# Altium schematic symbol library FPGA_Xilinx_Virtex7.SchLib: 34 symbols (part 31 of 34) (continued)
## XC7VX980T-FFG1930 (continued)
part M pins: AC1 MGTHTXN3_116 (io), AC2 MGTHTXP3_116 (io), AC5 MGTHRXN3_116 (io), AC6 MGTHRXP3_116 (io), AD7 MGTREFCLK0N_116 (io), AD8 MGTREFCLK0P_116 (io), AE1 MGTHTXN2_116 (io), AE2 MGTHTXP2_116 (io), AE5 MGTHRXN2_116 (io), AE6 MGTHRXP2_116 (io), AF3 MGTHTXN1_116 (io), AF4 MGTHTXP1_116 (io), AF7 MGTREFCLK1N_116 (io), AF8 MGTREFCLK1P_116 (io), AG1 MGTHTXN0_116 (io), AG2 MGTHTXP0_116 (io), AG5 MGTHRXN0_116 (io), AG6 MGTHRXP0_116 (io), AH3 MGTHRXN1_116 (io), AH4 MGTHRXP1_116 (io), AJ1 MGTHTXN3_115 (io), AJ2 MGTHTXP3_115 (io), AJ5 MGTHRXN3_115 (io), AJ6 MGTHRXP3_115 (io), AK3 MGTHTXN2_115 (io), AK4 MGTHTXP2_115 (io), AL1 MGTHTXN1_115 (io), AL2 MGTHTXP1_115 (io), AL5 MGTHRXN1_115 (io), AL6 MGTHRXP1_115 (io), AM3 MGTHRXN2_115 (io), AM4 MGTHRXP2_115 (io), AM7 MGTREFCLK0N_115 (io), AM8 MGTREFCLK0P_115 (io), AN1 MGTHTXN0_115 (io), AN2 MGTHTXP0_115 (io), AN5 MGTHRXN0_115 (io), AN6 MGTHRXP0_115 (io), AP7 MGTREFCLK1N_115 (io), AP8 MGTREFCLK1P_115 (io)
part N pins: AA1 MGTHTXN1_117 (io), AA2 MGTHTXP1_117 (io), AA5 MGTHRXN1_117 (io), AA6 MGTHRXP1_117 (io), AB3 MGTHTXN0_117 (io), AB4 MGTHTXP0_117 (io), AB7 MGTREFCLK1N_117 (io), AB8 MGTREFCLK1P_117 (io), AD3 MGTHRXN0_117 (io), AD4 MGTHRXP0_117 (io), N1 MGTHTXN3_118 (io), N2 MGTHTXP3_118 (io), N5 MGTHRXN3_118 (io), N6 MGTHRXP3_118 (io), P3 MGTHTXN2_118 (io), P4 MGTHTXP2_118 (io), R1 MGTHTXN1_118 (io), R2 MGTHTXP1_118 (io), R5 MGTHRXN2_118 (io), R6 MGTHRXP2_118 (io), T3 MGTHRXN1_118 (io), T4 MGTHRXP1_118 (io), T7 MGTREFCLK0N_118 (io), T8 MGTREFCLK0P_118 (io), U1 MGTHTXN0_118 (io), U2 MGTHTXP0_118 (io), U5 MGTHRXN0_118 (io), U6 MGTHRXP0_118 (io), V3 MGTHTXN3_117 (io), V4 MGTHTXP3_117 (io), V7 MGTREFCLK1N_118 (io), V8 MGTREFCLK1P_118 (io), W1 MGTHTXN2_117 (io), W2 MGTHTXP2_117 (io), W5 MGTHRXN3_117 (io), W6 MGTHRXP3_117 (io), Y3 MGTHRXN2_117 (io), Y4 MGTHRXP2_117 (io), Y7 MGTREFCLK0N_117 (io), Y8 MGTREFCLK0P_117 (io)
part O pins: AB2 MGTAVTT_G11 (power), AB6 MGTAVCC_G11 (power), AC4 MGTAVTT_G11 (power), AC8 MGTAVCC_G11 (power), AF2 MGTAVTT_G11 (power), AF6 MGTAVCC_G11 (power), AG4 MGTAVTT_G11 (power), AG8 MGTVCCAUX_G11 (power), AH6 MGTAVCC_G11 (power), AJ8 MGTVCCAUX_G10 (power), AK2 MGTAVTT_G10 (power), AK6 MGTAVCC_G10 (power), AK7 MGTAVTTRCAL_115 (power), AK8 MGTRREF_115 (power), AL4 MGTAVTT_G10 (power), AL8 MGTAVCC_G10 (power), AP2 MGTAVTT_G10 (power), AP6 MGTAVCC_G10 (power), AR4 MGTAVTT_G10 (power), AR8 MGTAVCC_G10 (power), AV2 MGTAVTT_G10 (power), AV6 MGTAVCC_G10 (power), AW4 MGTAVTT_G10 (power), AW8 MGTAVCC_G10 (power), BB2 MGTAVTT_G10 (power), BB6 MGTAVCC_G10 (power), BC4 MGTAVTT_G10 (power), BC8 MGTAVCC_G10 (power), P2 MGTAVTT_G11 (power), P6 MGTAVCC_G11 (power), R4 MGTAVTT_G11 (power), R8 MGTAVCC_G11 (power), V2 MGTAVTT_G11 (power), V6 MGTAVCC_G11 (power), W4 MGTAVTT_G11 (power), W8 MGTAVCC_G11 (power)
part P pins: AA10 TDI_0 (io), AB11 TDO_0 (io), AB22 VREFN_0 (io), AB23 VP_0 (io), AC10 INIT_B_0 (io), AC22 VN_0 (io), AC23 VREFP_0 (io), AD11 DONE_0 (io), AD22 DXN_0 (io), AD23 DXP_0 (io), AE10 PROGRAM_B_0 (io), AF11 CFGBVS_0 (io), AG10 M2_0 (io), AH11 M0_0 (io), AJ10 M1_0 (io), AJ11 VCCO_0 (power), AK10 VCCO_0 (power), V11 CCLK_0 (io), W10 TCK_0 (io), Y11 TMS_0 (io)
part Q pins: A12 GND (power), A22 GND (power), A32 GND (power), A42 GND (power), AA11 VCCINT (power), AA13 VCCINT (power), AA15 VCCINT (power), AA17 VCCAUX (power), AA19 VCCAUX_IO_G6 (power), AA21 VCCINT (power), AA22 GNDADC_0 (power), AA23 VCCADC_0 (power), AA25 VCCAUX_IO_G2 (power), AA27 VCCAUX_IO_G1 (power), AA29 VCCINT (power), AA31 VCCINT (power), AA33 VCCINT (power), AB10 VCCINT (power), AB12 VCCINT (power), AB14 VCCINT (power), AB16 VCCINT (power), AB18 VCCAUX_IO_G6 (power), AB20 VCCINT (power), AB24 VCCBRAM (power), AB26 VCCAUX_IO_G1 (power), AB28 VCCAUX (power), AB30 VCCINT (power), AB32 VCCINT (power), AC11 VCCINT (power), AC13 VCCINT (power), AC15 VCCINT (power), AC17 VCCAUX (power), AC19 VCCAUX_IO_G5 (power), AC21 VCCINT (power), AC25 VCCBRAM (power), AC27 VCCAUX_IO_G1 (power), AC29 VCCINT (power), AC31 VCCINT (power), AC33 VCCINT (power), AD10 VCCINT (power), AD12 VCCINT (power), AD14 VCCINT (power), AD16 VCCINT (power), AD18 VCCAUX_IO_G5 (power), AD20 VCCINT (power), AD24 VCCBRAM (power), AD26 VCCAUX_IO_G0 (power), AD28 VCCAUX (power), AD30 VCCINT (power), AD32 VCCINT (power), AE11 VCCINT (power), AE13 VCCINT (power), AE15 VCCINT (power), AE17 VCCAUX (power), AE19 VCCAUX_IO_G5 (power), AE21 VCCINT (power), AE23 VCCBRAM (power), AE25 VCCBRAM (power), AE27 VCCAUX_IO_G0 (power), AE29 VCCINT (power), AE31 VCCINT (power), AE33 VCCINT (power), AF10 VCCINT (power), AF12 VCCINT (power), AF14 VCCINT (power), AF16 VCCINT (power), AF18 VCCAUX_IO_G4 (power), AF20 VCCAUX_IO_G4 (power), AF22 VCCINT (power), AF24 VCCBRAM (power), AF26 VCCAUX_IO_G0 (power), AF28 VCCAUX (power), AF30 VCCINT (power), AF32 VCCINT (power), AG11 VCCINT (power), AG13 VCCINT (power), AG15 VCCINT (power), AG17 VCCAUX (power), AG19 VCCAUX_IO_G4 (power), AG21 VCCINT (power), AG23 VCCINT (power), AG25 VCCBRAM (power), AG27 VCCAUX (power), AG29 VCCINT (power), AG31 VCCINT (power), AG33 VCCINT (power), AH10 VCCINT (power), AH12 VCCINT (power), B9 GND (power), B19 GND (power), B29 GND (power), B39 GND (power), C6 GND (power), C16 GND (power), C26 GND (power), C36 GND (power), D3 GND (power), D13 GND (power), D23 GND (power), D33 GND (power), D43 GND (power), E10 GND (power), E20 GND (power), E30 GND (power), E40 GND (power), F7 GND (power), F17 GND (power), F27 GND (power), F37 GND (power), G4 GND (power), G14 GND (power), G24 GND (power), G34 GND (power), G44 GND (power), H1 GND (power), H11 GND (power), H21 GND (power), H31 GND (power), H41 GND (power), J8 GND (power), J18 GND (power), J28 GND (power), J38 GND (power), K5 GND (power), K15 GND (power), K25 GND (power), K35 GND (power), L2 GND (power), L12 GND (power), L22 GND (power), L32 GND (power), L42 GND (power), M1 GND (power), M2 GND (power), M3 GND (power), M4 GND (power), M5 GND (power), M6 GND (power), M7 GND (power), M9 GND (power), M19 GND (power), M29 GND (power), M39 GND (power), N3 GND (power), N4 GND (power), N7 GND (power), N8 GND (power), N9 GND (power), N16 GND (power), N26 GND (power), N36 GND (power), P1 GND (power), P5 GND (power), P9 GND (power), P13 GND (power), P23 GND (power), P33 GND (power), P43 GND (power), R3 GND (power), R7 GND (power), R9 GND (power), R10 GND (power), R20 GND (power), R30 GND (power), R40 GND (power), T1 GND (power), T2 GND (power), T5 GND (power), T6 GND (power), T9 GND (power), T10 VCCINT (power), T11 GND (power), T17 GND (power), T27 GND (power), T37 GND (power), U3 GND (power), U4 GND (power), U7 GND (power), U8 GND (power), U9 GND (power), U10 VCCBATT_0 (power), U11 VCCINT (power), U12 GND (power), U13 VCCINT (power), U14 GND (power), U24 GND (power), U27 VCCAUX_IO_G3 (power), U28 GND (power), U34 GND (power), V10 VCCINT (power), V12 VCCINT (power), V14 VCCINT (power), V16 VCCINT (power), V18 VCCAUX (power), V20 VCCINT (power), V22 VCCINT (power), V24 VCCBRAM (power), V26 VCCAUX_IO_G3 (power), V28 VCCAUX (power), V30 VCCINT (power), V32 VCCINT (power), W11 VCCINT (power), W13 VCCINT (power), W15 VCCINT (power), W17 VCCAUX (power), W19 VCCAUX_IO_G7 (power), W21 VCCINT (power), W23 VCCBRAM (power), W25 VCCAUX_IO_G2 (power), W27 VCCAUX_IO_G3 (power), W29 VCCINT (power), W31 VCCINT (power), W33 VCCINT (power), Y10 VCCINT (power), Y12 VCCINT (power), Y14 VCCINT (power), Y16 VCCINT (power), Y18 VCCAUX_IO_G6 (power), Y20 VCCINT (power), Y22 VCCINT (power), Y24 VCCBRAM (power), Y26 VCCAUX_IO_G2 (power), Y28 VCCAUX (power), Y30 VCCINT (power), Y32 VCCINT (power)
part R pins: AA3 GND (power), AA4 GND (power), AA7 GND (power), AA8 GND (power), AA9 GND (power), AA12 GND (power), AA14 GND (power), AA16 GND (power), AA18 GND (power), AA20 GND (power), AA24 GND (power), AA26 GND (power), AA28 GND (power), AA30 GND (power), AA32 GND (power), AA42 GND (power), AB1 GND (power), AB5 GND (power), AB9 GND (power), AB13 GND (power), AB15 GND (power), AB17 GND (power), AB19 GND (power), AB21 GND (power), AB25 GND (power), AB27 GND (power), AB29 GND (power), AB31 GND (power), AB33 GND (power), AB39 GND (power), AC3 GND (power), AC7 GND (power), AC9 GND (power), AC12 GND (power), AC14 GND (power), AC16 GND (power), AC18 GND (power), AC20 GND (power), AC24 GND (power), AC26 GND (power), AC28 GND (power), AC30 GND (power), AC32 GND (power), AC36 GND (power), AD1 GND (power), AD2 GND (power), AD5 GND (power), AD6 GND (power), AD9 GND (power), AD13 GND (power), AD15 GND (power), AD17 GND (power), AD19 GND (power), AD21 GND (power), AD25 GND (power), AD27 GND (power), AD29 GND (power), AD31 GND (power), AD33 GND (power), AD43 GND (power), AE3 GND (power), AE4 GND (power), AE7 GND (power), AE8 GND (power), AE9 GND (power), AE12 GND (power), AE14 GND (power), AE16 GND (power), AE18 GND (power), AE20 GND (power), AE22 GND (power), AE24 GND (power), AE26 GND (power), AE28 GND (power), AE30 GND (power), AE32 GND (power), AE40 GND (power), AF1 GND (power), AF5 GND (power), AF9 GND (power), AF13 GND (power), AF15 GND (power), AF17 GND (power), AF19 GND (power), AF21 GND (power), AF23 GND (power), AF25 GND (power), AF27 GND (power), AF29 GND (power), AF31 GND (power), AF33 GND (power), AF37 GND (power), AG3 GND (power), AG7 GND (power), AG9 GND (power), AG12 GND (power), AG14 GND (power), AG16 GND (power), AG18 GND (power), AG20 GND (power), AG22 GND (power), AG24 GND (power), AG26 GND (power), AG28 GND (power), AG30 GND (power), AG32 GND (power), AG34 GND (power), AG44 GND (power), AH1 GND (power), AH2 GND (power), AH5 GND (power), AH7 GND (power), AH8 GND (power), AH9 GND (power), AH13 GND (power), AH21 GND (power), AH31 GND (power), AH33 GND (power), AH41 GND (power), AJ3 GND (power), AJ4 GND (power), AJ7 GND (power), AJ9 GND (power), AJ18 GND (power), AJ28 GND (power), AJ38 GND (power), AK1 GND (power), AK5 GND (power), AK9 GND (power), AK15 GND (power), AK25 GND (power), AK35 GND (power), AL3 GND (power), AL7 GND (power), AL9 GND (power), AL12 GND (power), AL22 GND (power), AL32 GND (power), AL42 GND (power), AM1 GND (power), AM2 GND (power), AM5 GND (power), AM6 GND (power), AM9 GND (power), AM19 GND (power), AM29 GND (power), AM39 GND (power), AN3 GND (power), AN4 GND (power), AN7 GND (power), AN8 GND (power), AN9 GND (power), AN16 GND (power), AN26 GND (power), AN36 GND (power), AP1 GND (power), AP5 GND (power), AP9 GND (power), AP13 GND (power), AP23 GND (power), AP33 GND (power), AP43 GND (power), AR3 GND (power), AR7 GND (power), AR9 GND (power), AR10 GND (power), AR20 GND (power), AR30 GND (power), AR40 GND (power), AT1 GND (power), AT2 GND (power), AT5 GND (power), AT6 GND (power), AT9 GND (power), AT17 GND (power), AT27 GND (power), AT37 GND (power), AU3 GND (power), AU4 GND (power), AU7 GND (power), AU8 GND (power), AU9 GND (power), AU14 GND (power), AU24 GND (power), AU34 GND (power), AU44 GND (power), AV1 GND (power), AV5 GND (power), AV9 GND (power), AV11 GND (power), AV21 GND (power), AV31 GND (power), AV41 GND (power), AW3 GND (power), AW7 GND (power), AW9 GND (power), AW18 GND (power), AW28 GND (power), AW38 GND (power), AY1 GND (power), AY2 GND (power), AY5 GND (power), AY6 GND (power), AY9 GND (power), AY15 GND (power), AY25 GND (power), AY35 GND (power), BA3 GND (power), BA4 GND (power), BA7 GND (power), BA8 GND (power), BA9 GND (power), BA12 GND (power), BA22 GND (power), BA32 GND (power), BA42 GND (power), BB1 GND (power), BB5 GND (power), BB9 GND (power), BB19 GND (power), BB29 GND (power), BB39 GND (power), BC2 GND (power), BC3 GND (power), BC7 GND (power), BC9 GND (power), BC16 GND (power), BC26 GND (power), BC36 GND (power), BD5 GND (power), BD6 GND (power), BD9 GND (power), BD13 GND (power), BD23 GND (power), BD33 GND (power), U44 GND (power), V1 GND (power), V5 GND (power), V9 GND (power), V13 GND (power), V15 GND (power), V17 GND (power), V19 GND (power), V21 GND (power), V23 GND (power), V25 GND (power), V27 GND (power), V29 GND (power), V31 GND (power), V33 GND (power), V41 GND (power), W3 GND (power), W7 GND (power), W9 GND (power), W12 GND (power), W14 GND (power), W16 GND (power), W18 GND (power), W20 GND (power), W22 GND (power), W24 GND (power), W26 GND (power), W28 GND (power), W30 GND (power), W32 GND (power), W38 GND (power), Y1 GND (power), Y2 GND (power), Y5 GND (power), Y6 GND (power), Y9 GND (power), Y13 GND (power), Y15 GND (power), Y17 GND (power), Y19 GND (power), Y21 GND (power), Y23 GND (power), Y25 GND (power), Y27 GND (power), Y29 GND (power), Y31 GND (power), Y33 GND (power), Y35 GND (power)

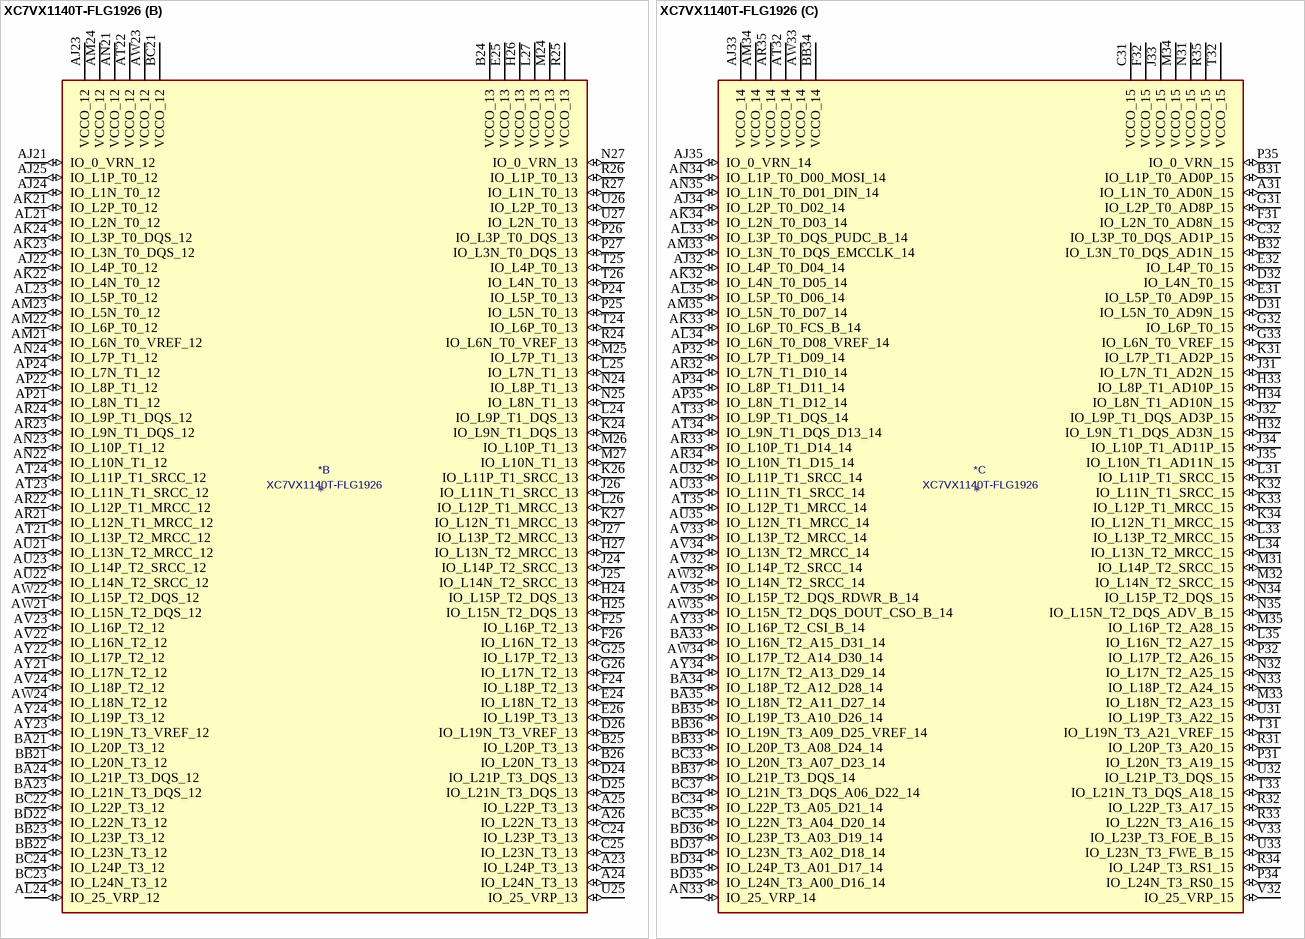
[diagram p156: symbol XC7VX1140T-FLG1926]

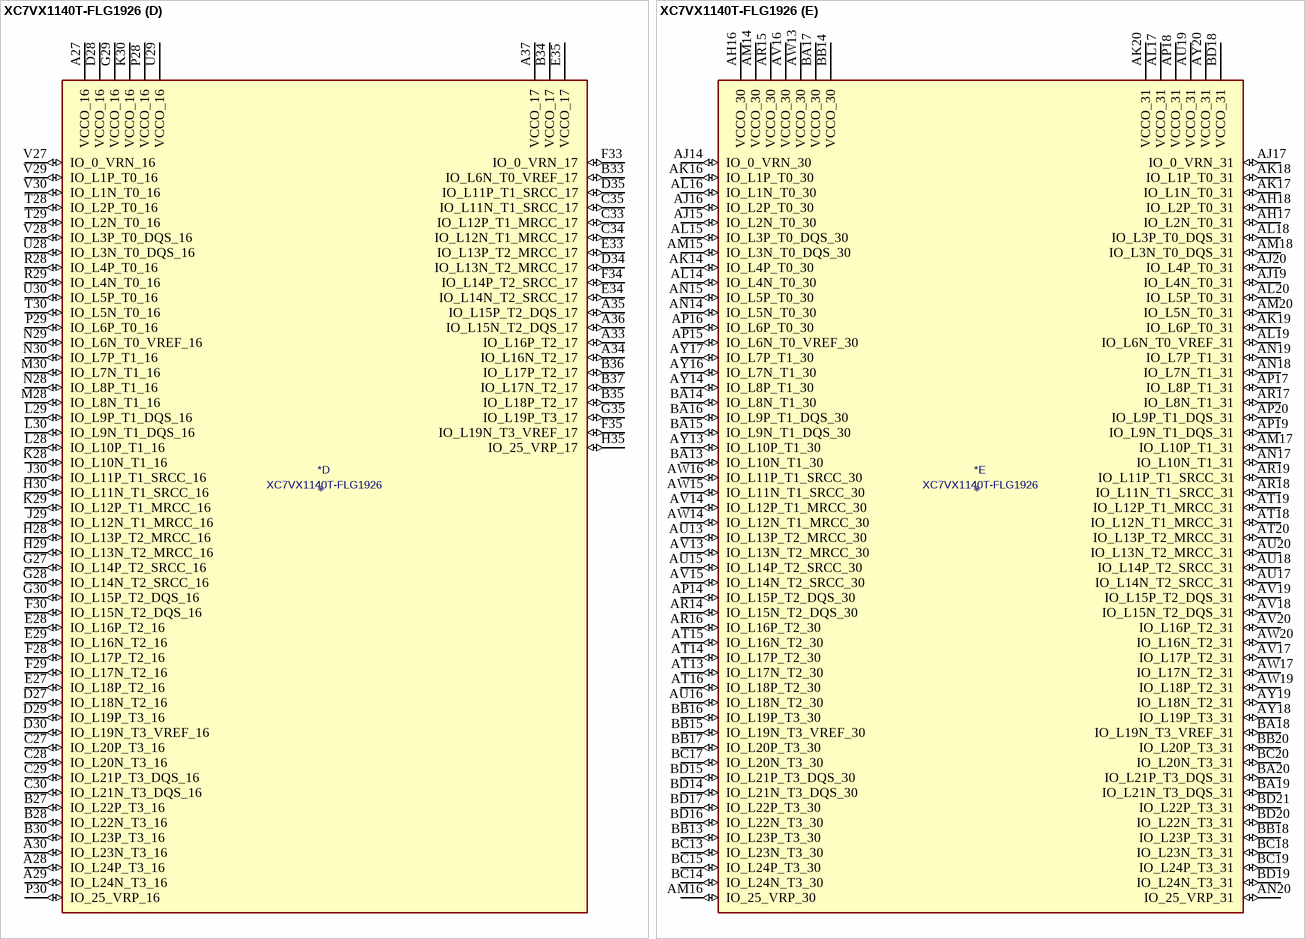
[diagram p157: symbol XC7VX1140T-FLG1926]

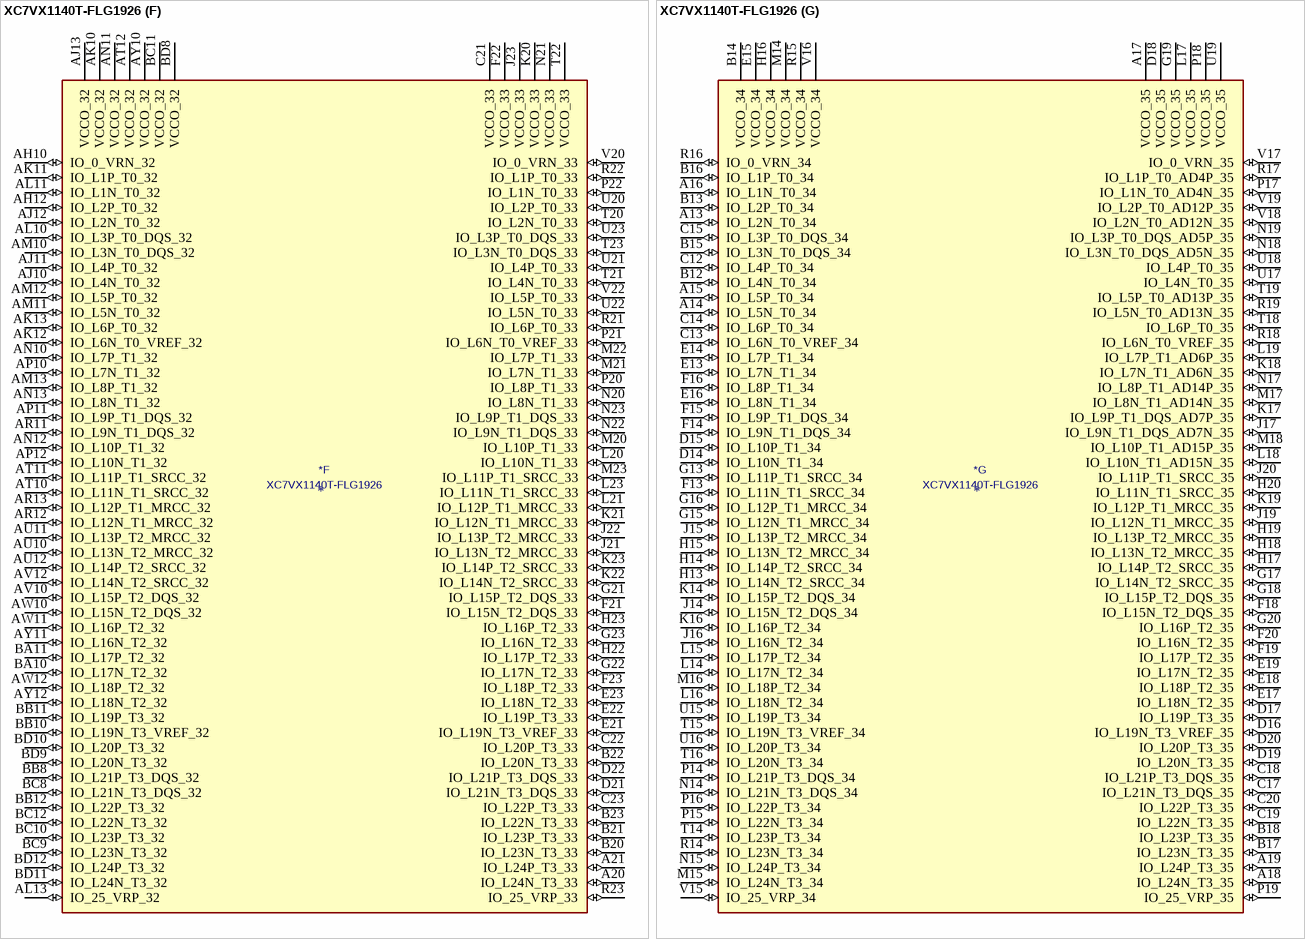
[diagram p158: symbol XC7VX1140T-FLG1926]

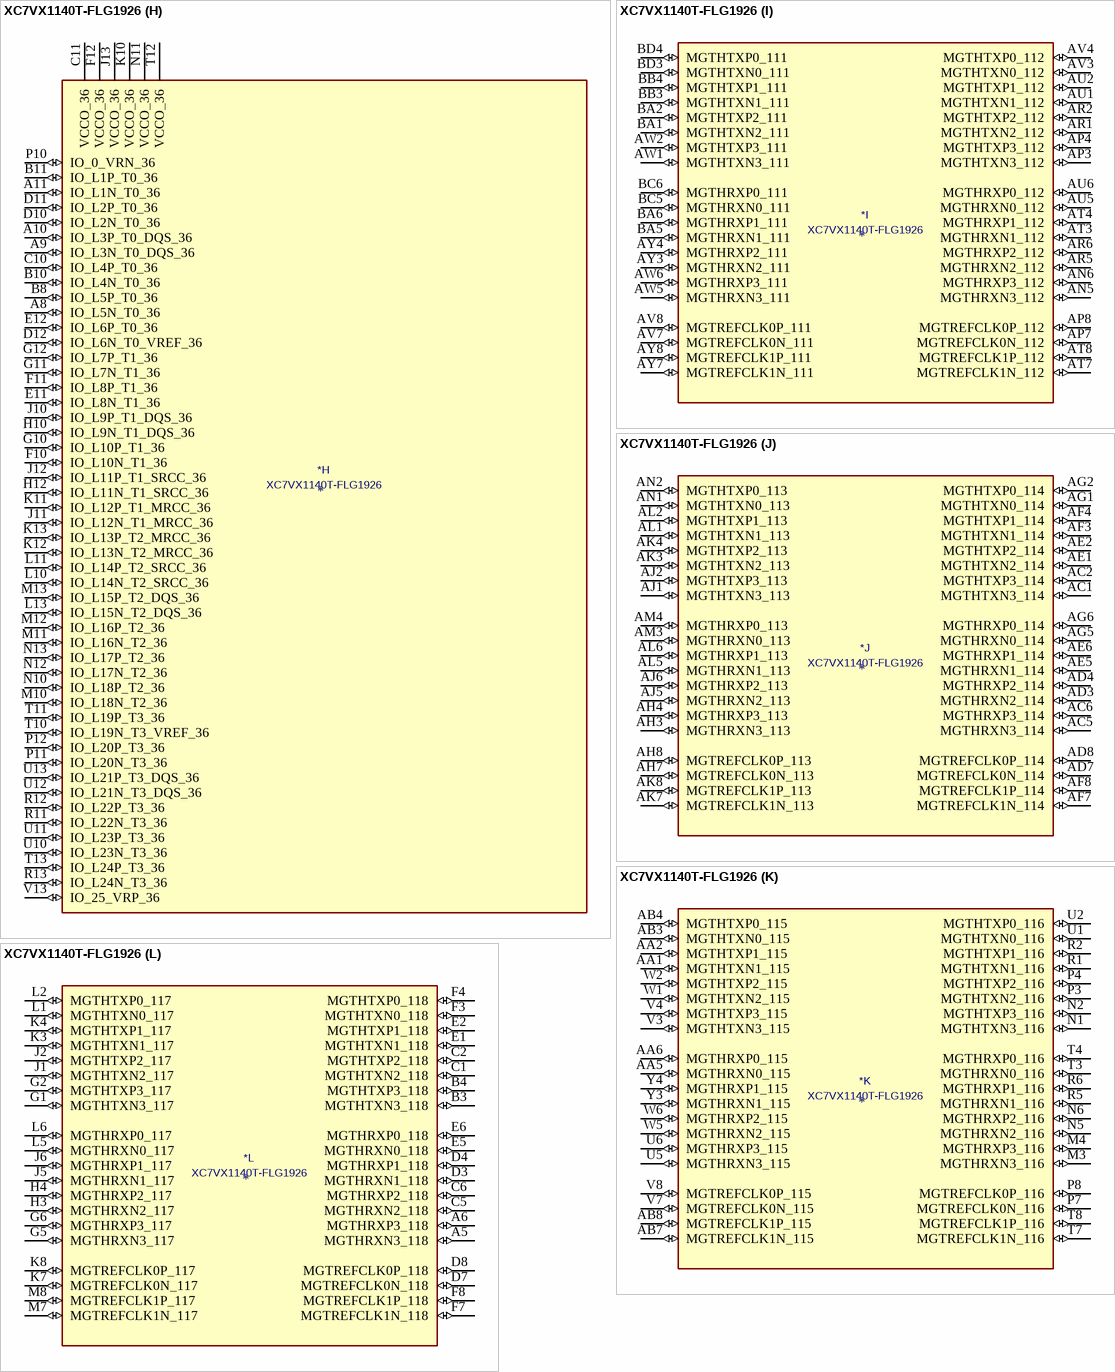
[diagram p159: symbol XC7VX1140T-FLG1926]

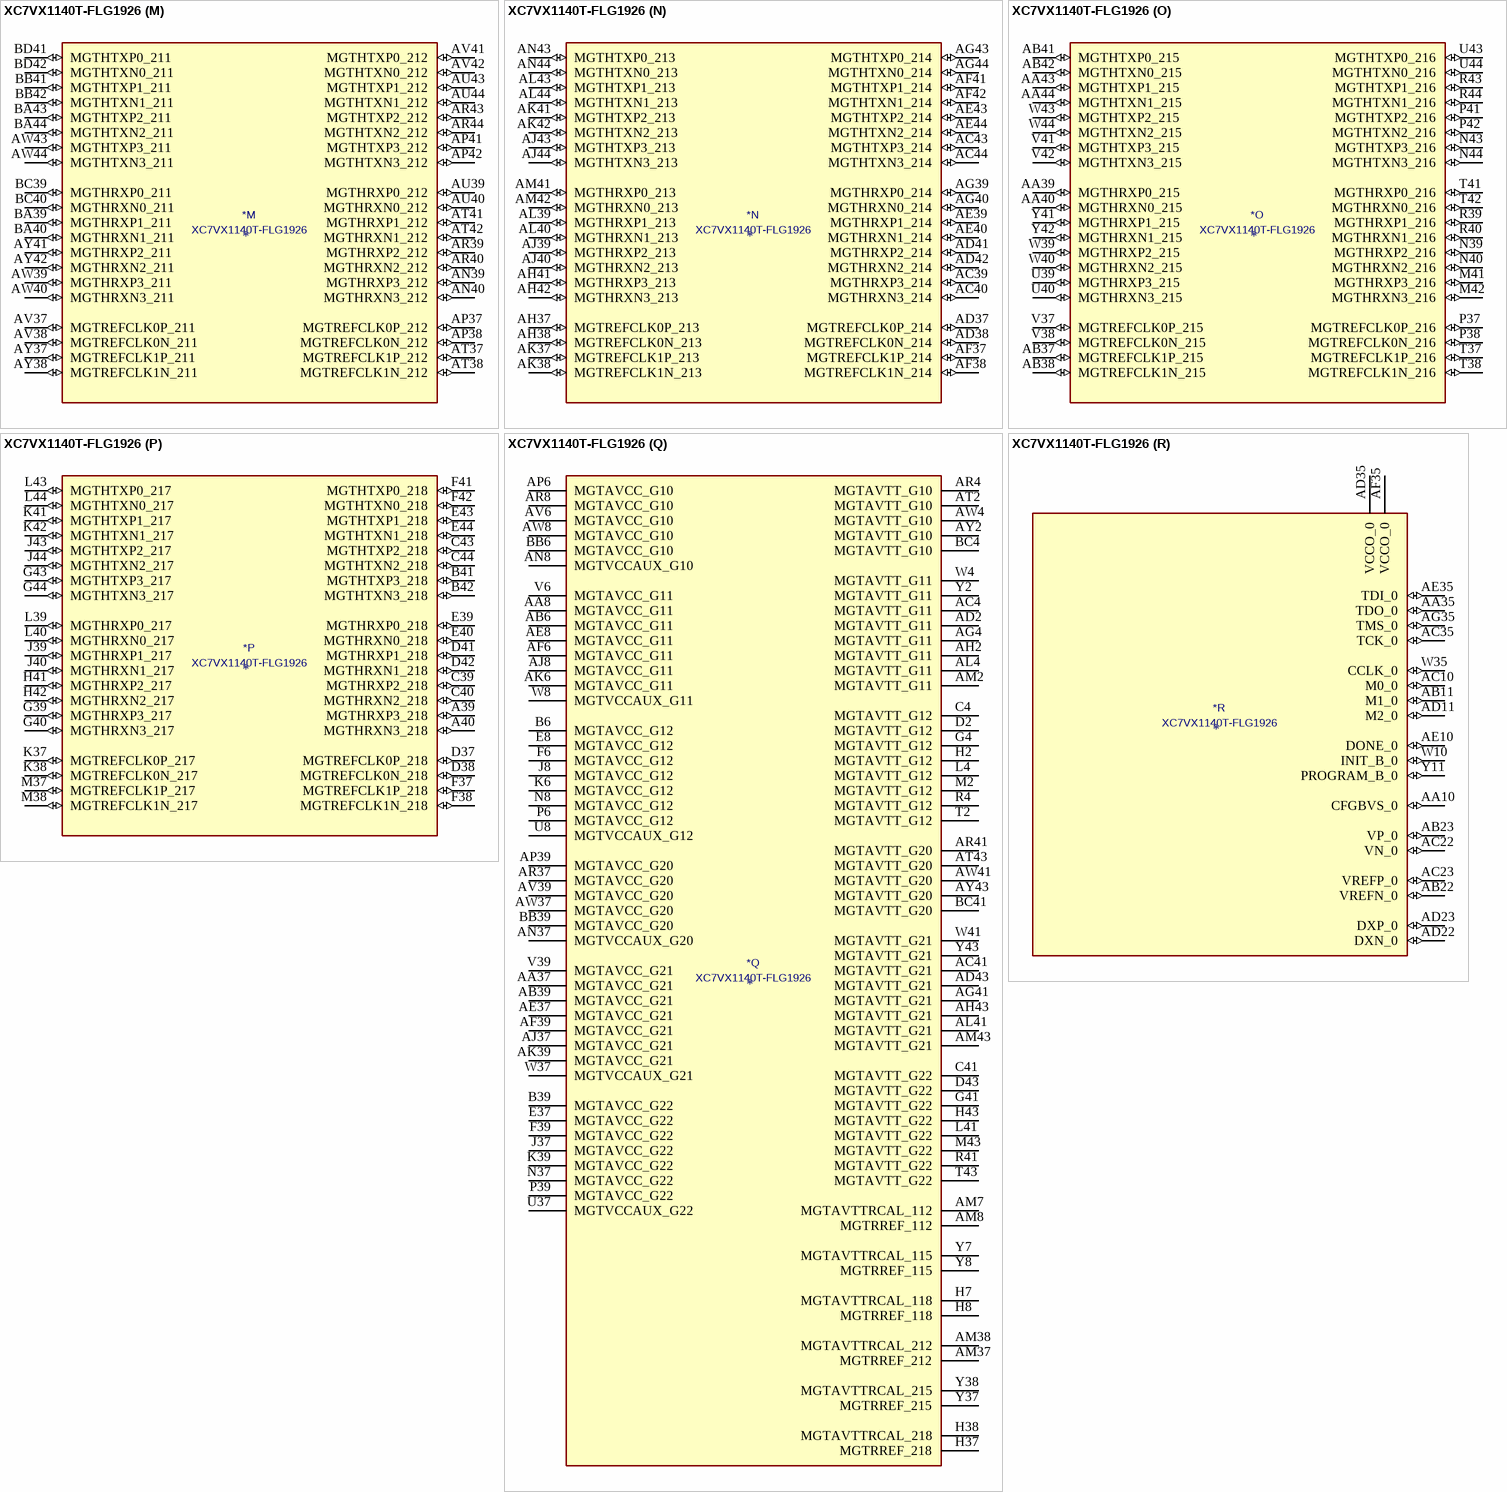
[diagram p160: symbol XC7VX1140T-FLG1926]

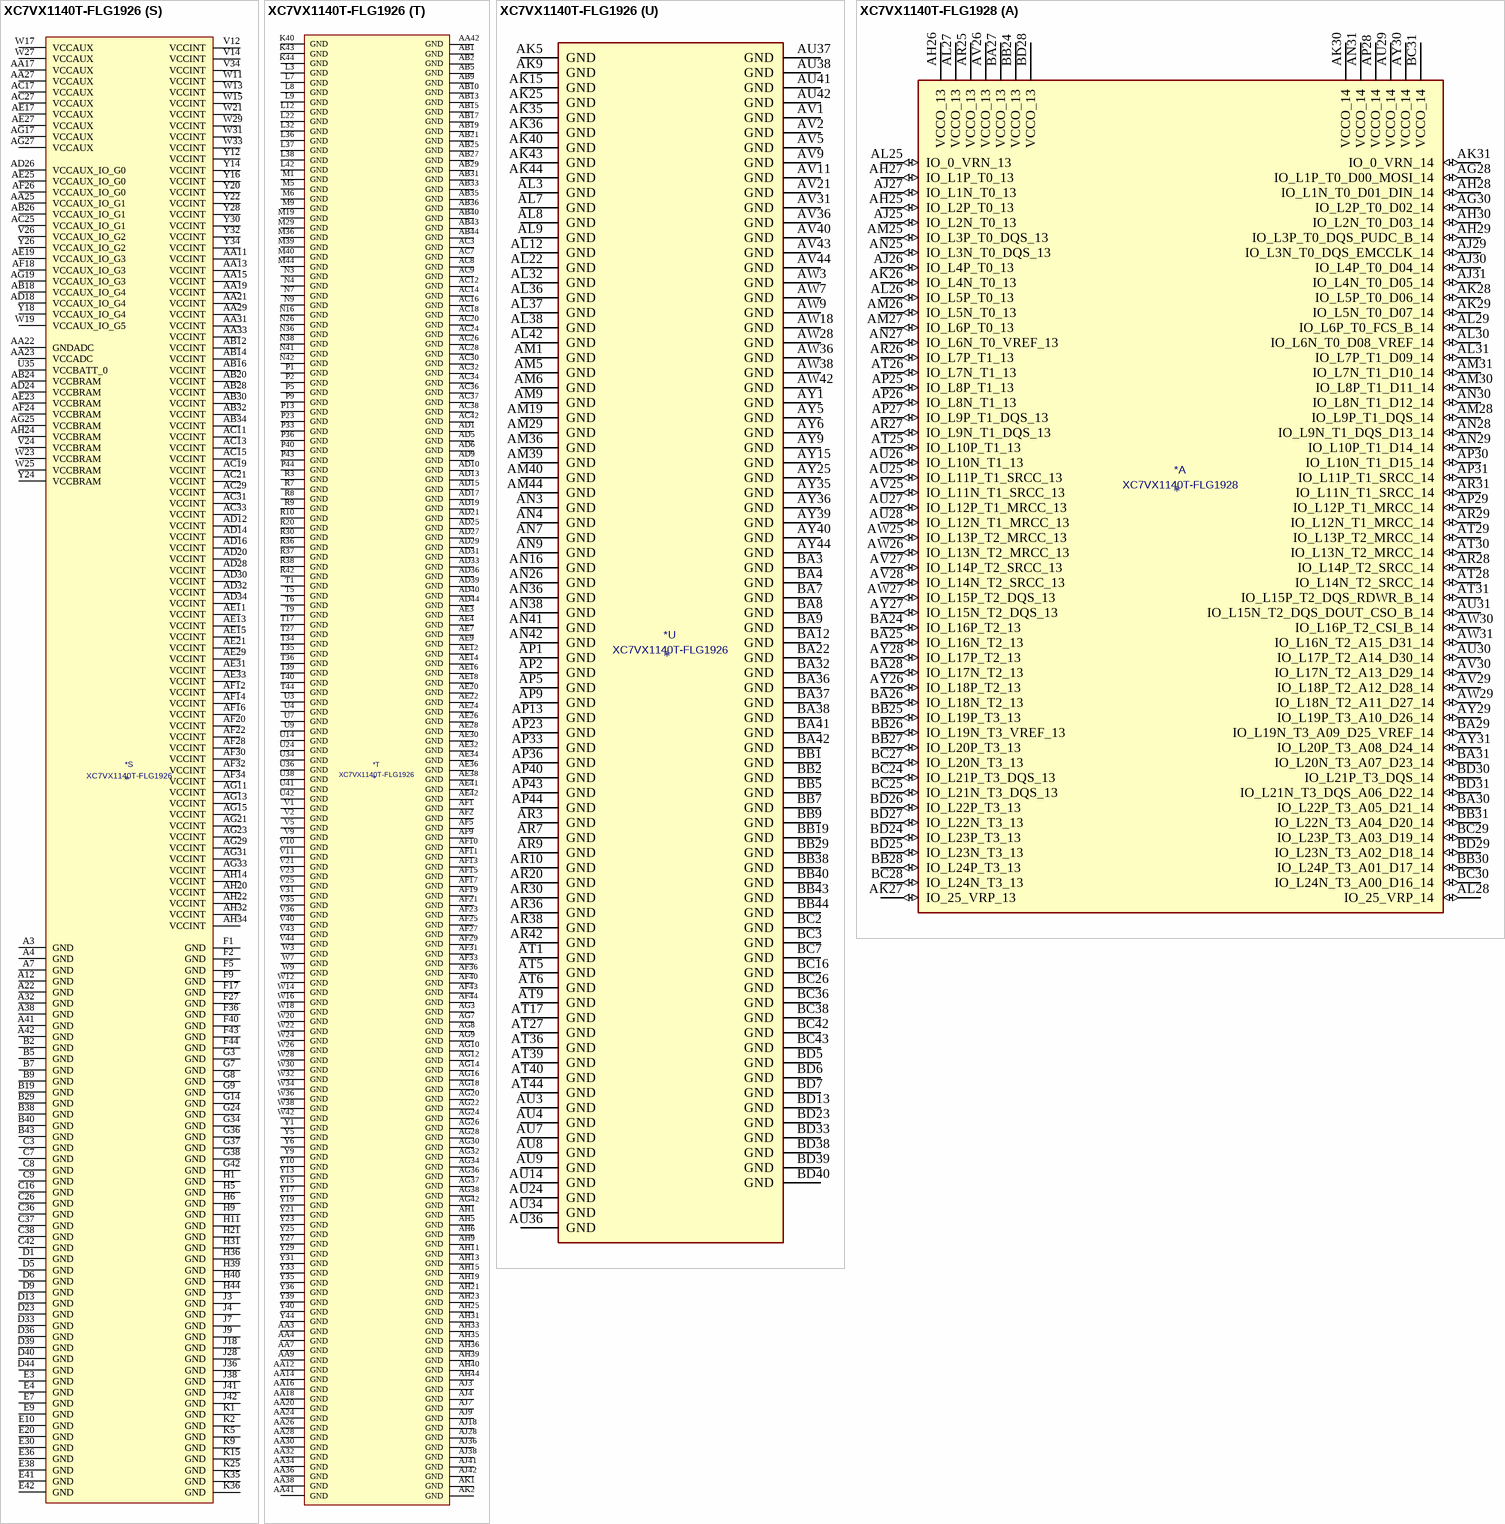
[diagram p161: symbols XC7VX1140T-FLG1926 to XC7VX1140T-FLG1928]